# Altium footprint library Sockets.PcbLib: 80 footprints (part 1 of 6)
Each footprint in its own frame and in the unit in brackets; x right, y up, seen from the top. Pads: shape width x height; smd on the part's side, far side on the other; paste and mask are expansions set on the pad; w line width, h text height; cw(c..) or ccw(c..) is an arc to the next point about the centre after c.
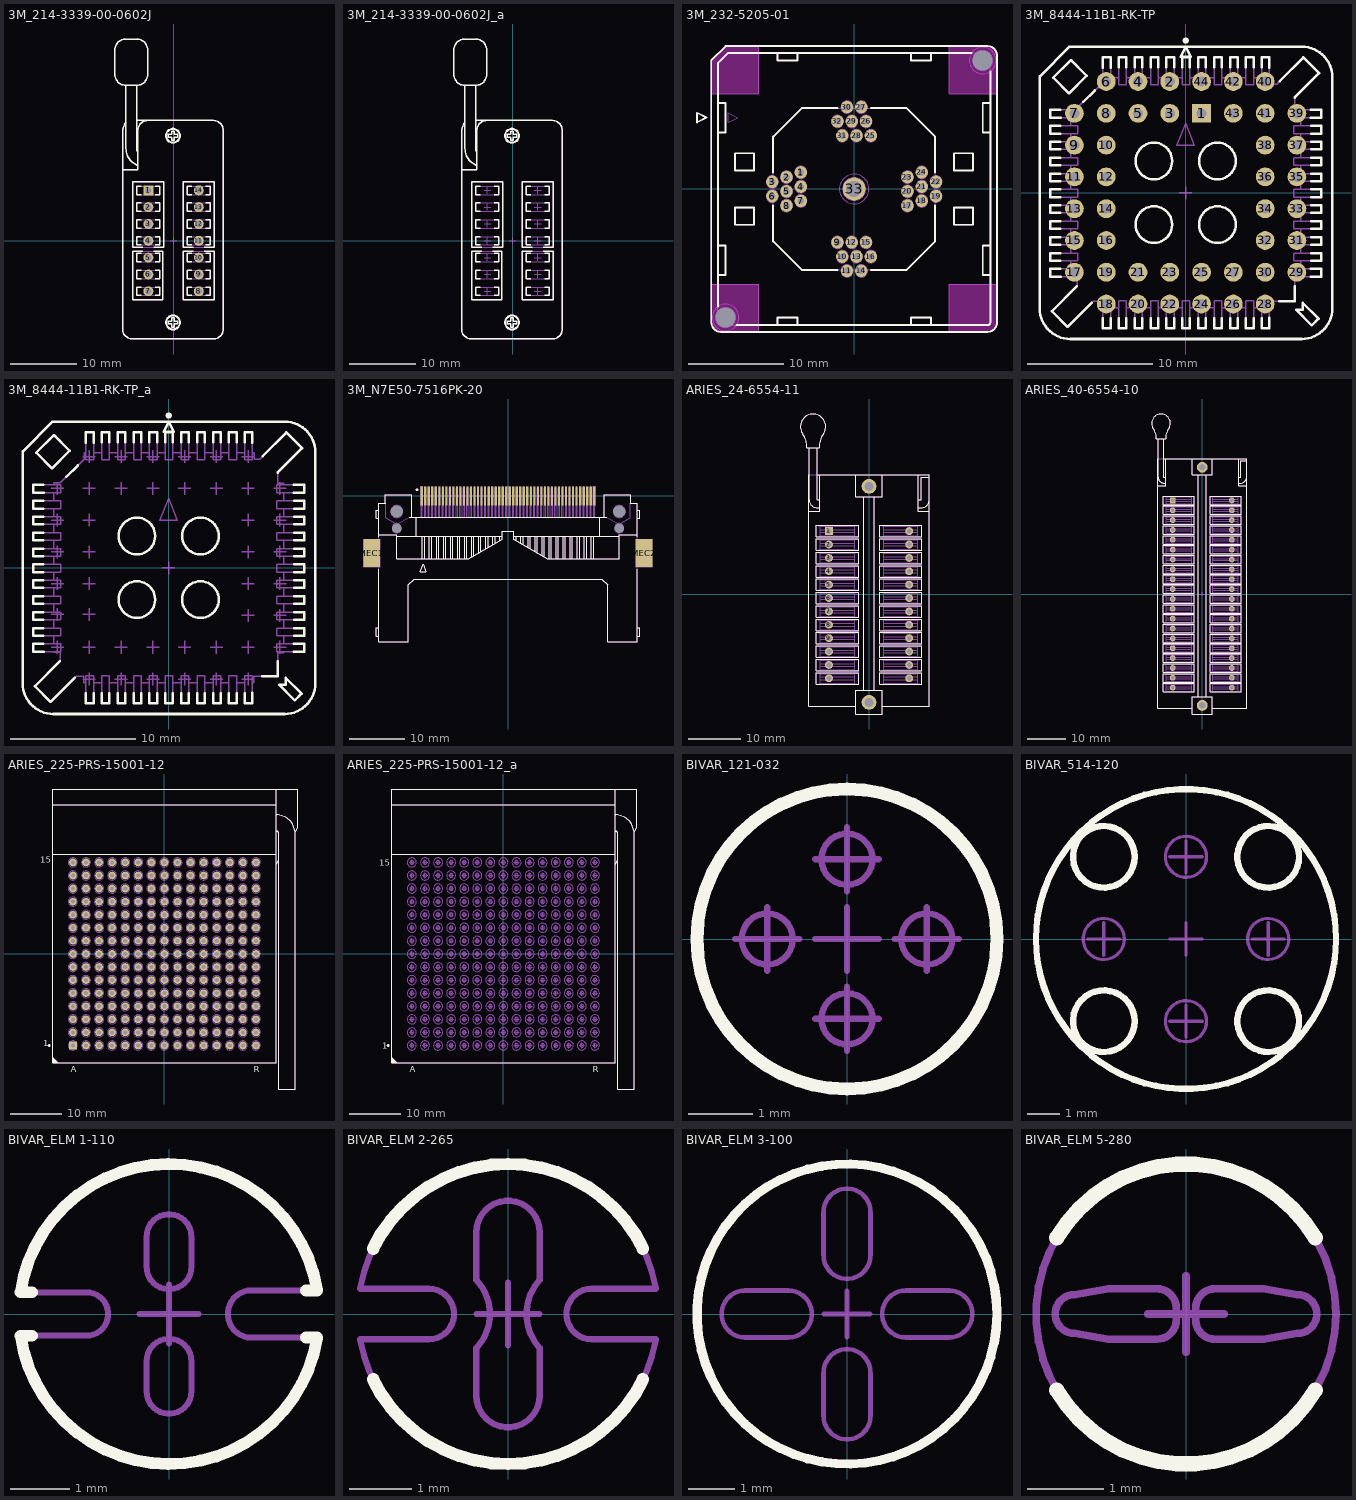
[diagram p0: the footprints below, top view; thin cyan lines are the x and y axes]

## 3M_214-3339-00-0602J [mm] "Pitch 2.54mm, Row-to-Row Spacing 7.62mm, DIP14  ZIF Test Socket"
height 11.9
pads (14):
  rect 1.5x1.5 hole 1: 1(-3.81,7.62)
  round 1.5 hole 1: 2(-3.81,5.08) 3(-3.81,2.54) 4(-3.81,0) 5(-3.81,-2.54) 6(-3.81,-5.08) 7(-3.81,-7.62) 8(3.81,-7.62) 9(3.81,-5.08) 10(3.81,-2.54) 11(3.81,0) 12(3.81,2.54) 13(3.81,5.08) 14(3.81,7.62)
Top Overlay:
  drawing of 156 lines, arcs and shapes, not listed
Mechanical 8:
  lines w0.1: -4.31,-7.62 -3.81,-7.62 ; -4.31,-5.08 -3.81,-5.08 ; -4.31,-2.54 -3.81,-2.54 ; -4.31,0 -3.81,0 ; -4.31,2.54 -3.81,2.54 ; -4.31,5.08 -3.81,5.08 ; -4.31,7.62 -3.81,7.62 ; -3.81,-8.12 -3.81,-7.62 ; -3.81,-7.12 -3.81,-7.62 ; -3.81,-5.58 -3.81,-5.08 ; -3.81,-4.58 -3.81,-5.08 ; -3.81,-3.04 -3.81,-2.54 ; -3.81,-2.04 -3.81,-2.54 ; -3.81,-0.5 -3.81,0 ; -3.81,0.5 -3.81,0 ; -3.81,2.04 -3.81,2.54 ; -3.81,3.04 -3.81,2.54 ; -3.81,4.58 -3.81,5.08 ; -3.81,5.58 -3.81,5.08 ; -3.81,7.12 -3.81,7.62 ; -3.81,8.12 -3.81,7.62 ; -3.31,-7.62 -3.81,-7.62 ; -3.31,-5.08 -3.81,-5.08 ; -3.31,-2.54 -3.81,-2.54 ; -3.31,0 -3.81,0 ; -3.31,2.54 -3.81,2.54 ; -3.31,5.08 -3.81,5.08 ; -3.31,7.62 -3.81,7.62 ; -0.5,0 0,0 ; 0,-0.5 0,0 ; 0,0.5 0,0 ; 0.5,0 0,0 ; 3.31,-7.62 3.81,-7.62 ; 3.31,-5.08 3.81,-5.08 ; 3.31,-2.54 3.81,-2.54 ; 3.31,0 3.81,0 ; 3.31,2.54 3.81,2.54 ; 3.31,5.08 3.81,5.08 ; 3.31,7.62 3.81,7.62 ; 3.81,-8.12 3.81,-7.62 ; 3.81,-7.12 3.81,-7.62 ; 3.81,-5.58 3.81,-5.08 ; 3.81,-4.58 3.81,-5.08 ; 3.81,-3.04 3.81,-2.54 ; 3.81,-2.04 3.81,-2.54 ; 3.81,-0.5 3.81,0 ; 3.81,0.5 3.81,0 ; 3.81,2.04 3.81,2.54 ; 3.81,3.04 3.81,2.54 ; 3.81,4.58 3.81,5.08 ; 3.81,5.58 3.81,5.08 ; 3.81,7.12 3.81,7.62 ; 3.81,8.12 3.81,7.62 ; 4.31,-7.62 3.81,-7.62 ; 4.31,-5.08 3.81,-5.08 ; 4.31,-2.54 3.81,-2.54 ; 4.31,0 3.81,0 ; 4.31,2.54 3.81,2.54 ; 4.31,5.08 3.81,5.08 ; 4.31,7.62 3.81,7.62
Mechanical 14:
  circle w0.1: c-0.09,15.87 r1.1
  circle w0.1: c-0.09,15.87 r1
  circle w0.1: c-0.09,-12.33 r1
  circle w0.1: c-0.09,-12.33 r1.1
  lines w0.1: -7.69,10.73 -5.39,10.73 -5.39,16.67 cw(c-3.89,16.67) -3.89,18.17 ; -7.19,17.788 ccw(c-6.19,16.67) -7.69,16.67 -7.69,-13.33 ccw(c-6.19,-13.33) -6.19,-14.83 6.01,-14.83 ccw(c6.01,-13.33) 7.51,-13.33 7.51,16.67 ccw(c6.01,16.67) 6.01,18.17 -5.59,18.17 ; -6.89,30.47 -5.89,30.47 ; -5.39,11.355 cw(c-4.39,13.97) -7.19,13.97 -7.19,23.47 ; -5.39,13.307 cw(c-4.39,13.97) -5.59,13.97 -5.59,23.47 ; -7.19,23.47 cw(c-7.19,25.17) -8.89,25.17 -8.89,28.77 cw(c-7.19,28.77) -7.19,30.47 -5.59,30.47 cw(c-5.59,28.77) -3.89,28.77 -3.89,25.17 cw(c-5.59,25.17) -5.59,23.47 ; -7.19,23.47 -5.59,23.47 ; -6.16,-8.89 -1.619,-8.89 -1.619,-1.587 -6.16,-1.587 -6.16,-8.89 ; -6.16,-0.953 -1.46,-0.953 -1.46,8.89 -6.16,8.89 -6.16,-0.953 ; -5.525,-8.255 -2.095,-8.255 -2.095,-6.985 -5.525,-6.985 -5.525,-8.255 ; -5.525,-5.715 -2.095,-5.715 -2.095,-4.445 -5.525,-4.445 -5.525,-5.715 ; -5.525,-3.175 -2.095,-3.175 -2.095,-1.905 -5.525,-1.905 -5.525,-3.175 ; -5.525,-0.635 -2.095,-0.635 -2.095,0.635 -5.525,0.635 -5.525,-0.635 ; -5.525,1.905 -2.095,1.905 -2.095,3.175 -5.525,3.175 -5.525,1.905 ; -5.525,4.445 -2.095,4.445 -2.095,5.715 -5.525,5.715 -5.525,4.445 ; -5.525,6.985 -2.095,6.985 -2.095,8.255 -5.525,8.255 -5.525,6.985 ; -0.79,-12.53 -0.29,-12.53 -0.29,-13.03 0.11,-13.03 0.11,-12.53 0.61,-12.53 0.61,-12.13 0.11,-12.13 0.11,-11.63 -0.29,-11.63 -0.29,-12.13 -0.79,-12.13 -0.79,-12.53 ; -0.79,15.67 -0.29,15.67 -0.29,15.17 0.11,15.17 0.11,15.67 0.61,15.67 0.61,16.07 0.11,16.07 0.11,16.57 -0.29,16.57 -0.29,16.07 -0.79,16.07 -0.79,15.67 ; 1.46,-8.89 6.16,-8.89 6.16,-1.587 1.46,-1.587 1.46,-8.89 ; 1.46,-0.953 6.16,-0.953 6.16,8.89 1.46,8.89 1.46,-0.953 ; 2.095,-8.255 5.525,-8.255 5.525,-6.985 2.095,-6.985 2.095,-8.255 ; 2.095,-5.715 5.525,-5.715 5.525,-4.445 2.095,-4.445 2.095,-5.715 ; 2.095,-3.175 5.525,-3.175 5.525,-1.905 2.095,-1.905 2.095,-3.175 ; 2.095,-0.635 5.525,-0.635 5.525,0.635 2.095,0.635 2.095,-0.635 ; 2.095,1.905 5.525,1.905 5.525,3.175 2.095,3.175 2.095,1.905 ; 2.095,4.445 5.525,4.445 5.525,5.715 2.095,5.715 2.095,4.445 ; 2.095,6.985 5.525,6.985 5.525,8.255 2.095,8.255 2.095,6.985
3D body "3M_214-3339-00-0602J.stp": height 11.9, standoff -2.79, extent -8.89,-14.83 7.51,30.47

## 3M_214-3339-00-0602J_a [mm] "Pitch 2.54mm, Row-to-Row Spacing 7.62mm, DIP14  ZIF Test Socket"
height 11.9
Top Overlay:
  drawing of 156 lines, arcs and shapes, not listed
Mechanical 8:
  lines w0.1: -4.31,-7.62 -3.81,-7.62 ; -4.31,-5.08 -3.81,-5.08 ; -4.31,-2.54 -3.81,-2.54 ; -4.31,0 -3.81,0 ; -4.31,2.54 -3.81,2.54 ; -4.31,5.08 -3.81,5.08 ; -4.31,7.62 -3.81,7.62 ; -3.81,-8.12 -3.81,-7.62 ; -3.81,-7.12 -3.81,-7.62 ; -3.81,-5.58 -3.81,-5.08 ; -3.81,-4.58 -3.81,-5.08 ; -3.81,-3.04 -3.81,-2.54 ; -3.81,-2.04 -3.81,-2.54 ; -3.81,-0.5 -3.81,0 ; -3.81,0.5 -3.81,0 ; -3.81,2.04 -3.81,2.54 ; -3.81,3.04 -3.81,2.54 ; -3.81,4.58 -3.81,5.08 ; -3.81,5.58 -3.81,5.08 ; -3.81,7.12 -3.81,7.62 ; -3.81,8.12 -3.81,7.62 ; -3.31,-7.62 -3.81,-7.62 ; -3.31,-5.08 -3.81,-5.08 ; -3.31,-2.54 -3.81,-2.54 ; -3.31,0 -3.81,0 ; -3.31,2.54 -3.81,2.54 ; -3.31,5.08 -3.81,5.08 ; -3.31,7.62 -3.81,7.62 ; -0.5,0 0,0 ; 0,-0.5 0,0 ; 0,0.5 0,0 ; 0.5,0 0,0 ; 3.31,-7.62 3.81,-7.62 ; 3.31,-5.08 3.81,-5.08 ; 3.31,-2.54 3.81,-2.54 ; 3.31,0 3.81,0 ; 3.31,2.54 3.81,2.54 ; 3.31,5.08 3.81,5.08 ; 3.31,7.62 3.81,7.62 ; 3.81,-8.12 3.81,-7.62 ; 3.81,-7.12 3.81,-7.62 ; 3.81,-5.58 3.81,-5.08 ; 3.81,-4.58 3.81,-5.08 ; 3.81,-3.04 3.81,-2.54 ; 3.81,-2.04 3.81,-2.54 ; 3.81,-0.5 3.81,0 ; 3.81,0.5 3.81,0 ; 3.81,2.04 3.81,2.54 ; 3.81,3.04 3.81,2.54 ; 3.81,4.58 3.81,5.08 ; 3.81,5.58 3.81,5.08 ; 3.81,7.12 3.81,7.62 ; 3.81,8.12 3.81,7.62 ; 4.31,-7.62 3.81,-7.62 ; 4.31,-5.08 3.81,-5.08 ; 4.31,-2.54 3.81,-2.54 ; 4.31,0 3.81,0 ; 4.31,2.54 3.81,2.54 ; 4.31,5.08 3.81,5.08 ; 4.31,7.62 3.81,7.62
Mechanical 14:
  circle w0.1: c-0.09,15.87 r1.1
  circle w0.1: c-0.09,15.87 r1
  circle w0.1: c-0.09,-12.33 r1
  circle w0.1: c-0.09,-12.33 r1.1
  lines w0.1: -7.69,10.73 -5.39,10.73 -5.39,16.67 cw(c-3.89,16.67) -3.89,18.17 ; -7.19,17.788 ccw(c-6.19,16.67) -7.69,16.67 -7.69,-13.33 ccw(c-6.19,-13.33) -6.19,-14.83 6.01,-14.83 ccw(c6.01,-13.33) 7.51,-13.33 7.51,16.67 ccw(c6.01,16.67) 6.01,18.17 -5.59,18.17 ; -6.89,30.47 -5.89,30.47 ; -5.39,11.355 cw(c-4.39,13.97) -7.19,13.97 -7.19,23.47 ; -5.39,13.307 cw(c-4.39,13.97) -5.59,13.97 -5.59,23.47 ; -7.19,23.47 cw(c-7.19,25.17) -8.89,25.17 -8.89,28.77 cw(c-7.19,28.77) -7.19,30.47 -5.59,30.47 cw(c-5.59,28.77) -3.89,28.77 -3.89,25.17 cw(c-5.59,25.17) -5.59,23.47 ; -7.19,23.47 -5.59,23.47 ; -6.16,-8.89 -1.619,-8.89 -1.619,-1.587 -6.16,-1.587 -6.16,-8.89 ; -6.16,-0.953 -1.46,-0.953 -1.46,8.89 -6.16,8.89 -6.16,-0.953 ; -5.525,-8.255 -2.095,-8.255 -2.095,-6.985 -5.525,-6.985 -5.525,-8.255 ; -5.525,-5.715 -2.095,-5.715 -2.095,-4.445 -5.525,-4.445 -5.525,-5.715 ; -5.525,-3.175 -2.095,-3.175 -2.095,-1.905 -5.525,-1.905 -5.525,-3.175 ; -5.525,-0.635 -2.095,-0.635 -2.095,0.635 -5.525,0.635 -5.525,-0.635 ; -5.525,1.905 -2.095,1.905 -2.095,3.175 -5.525,3.175 -5.525,1.905 ; -5.525,4.445 -2.095,4.445 -2.095,5.715 -5.525,5.715 -5.525,4.445 ; -5.525,6.985 -2.095,6.985 -2.095,8.255 -5.525,8.255 -5.525,6.985 ; -0.79,-12.53 -0.29,-12.53 -0.29,-13.03 0.11,-13.03 0.11,-12.53 0.61,-12.53 0.61,-12.13 0.11,-12.13 0.11,-11.63 -0.29,-11.63 -0.29,-12.13 -0.79,-12.13 -0.79,-12.53 ; -0.79,15.67 -0.29,15.67 -0.29,15.17 0.11,15.17 0.11,15.67 0.61,15.67 0.61,16.07 0.11,16.07 0.11,16.57 -0.29,16.57 -0.29,16.07 -0.79,16.07 -0.79,15.67 ; 1.46,-8.89 6.16,-8.89 6.16,-1.587 1.46,-1.587 1.46,-8.89 ; 1.46,-0.953 6.16,-0.953 6.16,8.89 1.46,8.89 1.46,-0.953 ; 2.095,-8.255 5.525,-8.255 5.525,-6.985 2.095,-6.985 2.095,-8.255 ; 2.095,-5.715 5.525,-5.715 5.525,-4.445 2.095,-4.445 2.095,-5.715 ; 2.095,-3.175 5.525,-3.175 5.525,-1.905 2.095,-1.905 2.095,-3.175 ; 2.095,-0.635 5.525,-0.635 5.525,0.635 2.095,0.635 2.095,-0.635 ; 2.095,1.905 5.525,1.905 5.525,3.175 2.095,3.175 2.095,1.905 ; 2.095,4.445 5.525,4.445 5.525,5.715 2.095,5.715 2.095,4.445 ; 2.095,6.985 5.525,6.985 5.525,8.255 2.095,8.255 2.095,6.985
3D body "3M_214-3339-00-0602J.stp": height 11.9, standoff -2.79, extent -8.89,-14.83 7.51,30.47

## 3M_232-5205-01 [mm] "Through Hole Socket for 0.5mm Pitch 32 Pins QFN, Body 30 x30mm"
height 14.5
pads (35):
  round 1.3 hole 0.7: 1(-5.6,1.75) 2(-7.1,1.25) 3(-8.6,0.75) 4(-5.6,0.25) 5(-7.1,-0.25) 6(-8.6,-0.75) 7(-5.6,-1.25) 8(-7.1,-1.75) 9(-1.75,-5.6) 10(-1.25,-7.1) 11(-0.75,-8.6) 12(-0.25,-5.6) 13(0.25,-7.1) 14(0.75,-8.6) 15(1.25,-5.6) 16(1.75,-7.1) 17(5.6,-1.75) 18(7.1,-1.25) 19(8.6,-0.75) 20(5.6,-0.25) 21(7.1,0.25) 22(8.6,0.75) 23(5.6,1.25) 24(7.1,1.75) 25(1.75,5.6) 26(1.25,7.1) 27(0.75,8.6) 28(0.25,5.6) 29(-0.25,7.1) 30(-0.75,8.6) 31(-1.25,5.6) 32(-1.75,7.1)
  round 2.4 hole 1.7: 33(0,0)
  round 0.5 hole 2.1 unplated mask+0.8: 34(-13.5,-13.5) 35(13.5,13.5)
Top Layer keep-out:
  region: -10,-10 -10,-15 -14,-15 -14.098,-15 -14.292,-14.962 -14.474,-14.886 -14.637,-14.777 -14.777,-14.637 -14.886,-14.474 -14.962,-14.292 -15,-14.098 -15,-14 -15,-10
  region: 10,-10 15,-10 15,-14 15,-14.098 14.962,-14.292 14.886,-14.474 14.777,-14.637 14.637,-14.777 14.474,-14.886 14.292,-14.962 14.098,-15 14,-15 10,-15
  region: 10,10 10,15 14,15 14.098,15 14.292,14.962 14.474,14.886 14.637,14.777 14.777,14.637 14.886,14.474 14.962,14.292 15,14.098 15,14 15,10
  region: -10,15 -13.5,15 -15,13.5 -15,10 -10,10
Top Overlay:
  lines w0.2: -14.3,-12.351 -14.3,13.21 -13.21,14.3 12.351,14.3 ; -14.3,-9.05 -13.5,-9.05 -13.5,-5.95 -14.3,-5.95 ; -14.3,5.95 -13.5,5.95 -13.5,9.05 -14.3,9.05 ; -12.351,-14.3 14,-14.3 ccw(c14,-14) 14.3,-14 14.3,12.351 ; -8.5,-1.745 -8.5,-5.5 -5.5,-8.5 -1.745,-8.5 ; -8.5,1.745 -8.5,5.5 -5.5,8.5 -1.745,8.5 ; -8.05,-14.3 -8.05,-13.5 -5.95,-13.5 -5.95,-14.3 ; -8.05,14.3 -8.05,13.5 -5.95,13.5 -5.95,14.3 ; 1.745,-8.5 5.5,-8.5 8.5,-5.5 8.5,-1.745 ; 1.745,8.5 5.5,8.5 8.5,5.5 8.5,1.745 ; 5.95,-14.3 5.95,-13.5 8.05,-13.5 8.05,-14.3 ; 5.95,14.3 5.95,13.5 8.05,13.5 8.05,14.3 ; 14.3,-9.05 13.5,-9.05 13.5,-5.95 14.3,-5.95 ; 14.3,5.95 13.5,5.95 13.5,9.05 14.3,9.05 ; -16.5,7 -15.5,7.5 -16.5,8 -16.5,7 ; -15,-14 ccw(c-14,-14) -14,-15 14,-15 ccw(c14,-14) 15,-14 15,14 ccw(c14,14) 14,15 -13.5,15 -15,13.5 -15,-14 ; -12.5,-3.75 -10.5,-3.75 -10.5,-1.95 -12.5,-1.95 -12.5,-3.75 ; -12.5,1.95 -12.5,3.75 -10.5,3.75 -10.5,1.95 -12.5,1.95 ; 10.5,-3.75 10.5,-1.95 12.5,-1.95 12.5,-3.75 10.5,-3.75 ; 10.5,1.95 10.5,3.75 12.5,3.75 12.5,1.95 10.5,1.95
Mechanical 8:
  drawing of 211 lines, arcs and shapes, not listed
Mechanical 14:
  lines w0.1: -14.3,-9.05 -13.5,-9.05 -13.5,-5.95 -14.3,-5.95 ; -14.3,5.95 -13.5,5.95 -13.5,9.05 -14.3,9.05 ; -8.05,-14.3 -8.05,-13.5 -5.95,-13.5 -5.95,-14.3 ; -8.05,14.3 -8.05,13.5 -5.95,13.5 -5.95,14.3 ; 5.95,-14.3 5.95,-13.5 8.05,-13.5 8.05,-14.3 ; 5.95,14.3 5.95,13.5 8.05,13.5 8.05,14.3 ; 14.3,-9.05 13.5,-9.05 13.5,-5.95 14.3,-5.95 ; 14.3,5.95 13.5,5.95 13.5,9.05 14.3,9.05 ; -15,-14 ccw(c-14,-14) -14,-15 14,-15 ccw(c14,-14) 15,-14 15,14 ccw(c14,14) 14,15 -13.5,15 -15,13.5 -15,-14 ; -14.3,-14 ccw(c-14,-14) -14,-14.3 14,-14.3 ccw(c14,-14) 14.3,-14 14.3,14 ccw(c14,14) 14,14.3 -13.21,14.3 -14.3,13.21 -14.3,-14 ; -13.2,7 -12.2,7.5 -13.2,8 -13.2,7 ; -12.5,-3.75 -10.5,-3.75 -10.5,-1.95 -12.5,-1.95 -12.5,-3.75 ; -12.5,1.95 -12.5,3.75 -10.5,3.75 -10.5,1.95 -12.5,1.95 ; -8.5,-5.5 -5.5,-8.5 5.5,-8.5 8.5,-5.5 8.5,5.5 5.5,8.5 -5.5,8.5 -8.5,5.5 -8.5,-5.5 ; 10.5,-3.75 10.5,-1.95 12.5,-1.95 12.5,-3.75 10.5,-3.75 ; 10.5,1.95 10.5,3.75 12.5,3.75 12.5,1.95 10.5,1.95
3D body "3M_232-5205-01.stp": height 17, standoff -3, extent -15,-15 15,15

## 3M_8444-11B1-RK-TP [mm] "44 Leads Through Hole PLCC Socket, Pitch 1.27 mm, Body 23.5x23.5mm"
height 8
pads (44):
  rect 1.5x1.5 hole 0.8: 1(1.27,6.35)
  round 1.5 hole 0.8: 2(-1.27,8.89) 3(-1.27,6.35) 4(-3.81,8.89) 5(-3.81,6.35) 6(-6.35,8.89) 7(-8.89,6.35) 8(-6.35,6.35) 9(-8.89,3.81) 10(-6.35,3.81) 11(-8.89,1.27) 12(-6.35,1.27) 13(-8.89,-1.27) 14(-6.35,-1.27) 15(-8.89,-3.81) 16(-6.35,-3.81) 17(-8.89,-6.35) 18(-6.35,-8.89) 19(-6.35,-6.35) 20(-3.81,-8.89) 21(-3.81,-6.35) 22(-1.27,-8.89) 23(-1.27,-6.35) 24(1.27,-8.89) 25(1.27,-6.35) 26(3.81,-8.89) 27(3.81,-6.35) 28(6.35,-8.89) 29(8.89,-6.35) 30(6.35,-6.35) 31(8.89,-3.81) 32(6.35,-3.81) 33(8.89,-1.27) 34(6.35,-1.27) 35(8.89,1.27) 36(6.35,1.27) 37(8.89,3.81) 38(6.35,3.81) 39(8.89,6.35) 40(6.35,8.89) 41(6.35,6.35) 42(3.81,8.89) 43(3.81,6.35) 44(1.27,8.89)
Top Overlay:
  drawing of 166 lines, arcs and shapes, not listed
Mechanical 8:
  drawing of 356 lines, arcs and shapes, not listed
Mechanical 14:
  drawing of 272 lines, arcs and shapes, not listed
3D body "3M_8444-11B1-RK-TP.stp": height 8, standoff -3.07, extent -11.659,-11.685 11.709,11.685

## 3M_8444-11B1-RK-TP_a [mm] "44 Leads Through Hole PLCC Socket, Pitch 1.27 mm, Body 23.5x23.5mm"
height 8
Top Overlay:
  drawing of 166 lines, arcs and shapes, not listed
Mechanical 8:
  drawing of 356 lines, arcs and shapes, not listed
Mechanical 14:
  drawing of 272 lines, arcs and shapes, not listed
3D body "3M_8444-11B1-RK-TP.stp": height 8, standoff -3.07, extent -11.659,-11.685 11.709,11.685

## 3M_N7E50-7516PK-20 [mm] "50 Contacts, Right Angle, Surface Mount CompactFlash Card Header Type I"
height 6.72
pads (56):
  rect 0.4x3.5 smd: 1(-15.558,0) 2(-14.288,0) 3(-13.018,0) 4(-11.748,0) 5(-10.478,0) 6(-9.208,0) 7(-7.938,0) 8(-6.668,0) 9(-5.398,0) 10(-4.128,0) 11(-2.858,0) 12(-1.588,0) 13(-0.318,0) 14(0.952,0) 15(2.222,0) 16(3.492,0) 17(4.762,0) 18(6.032,0) 19(7.302,0) 20(8.572,0) 21(9.842,0) 22(11.112,0) 23(12.382,0) 24(13.652,0) 25(14.922,0) 26(-14.923,0) 27(-13.653,0) 28(-12.383,0) 29(-11.113,0) 30(-9.843,0) 31(-8.573,0) 32(-7.303,0) 33(-6.033,0) 34(-4.763,0) 35(-3.493,0) 36(-2.223,0) 37(-0.953,0) 38(0.317,0) 39(1.587,0) 40(2.857,0) 41(4.127,0) 42(5.397,0) 43(6.667,0) 44(7.937,0) 45(9.207,0) 46(10.477,0) 47(11.747,0) 48(13.017,0) 49(14.287,0) 50(15.557,0)
  rect 3x5 smd: MEC1(-24.565,-10.3) MEC2(24.565,-10.3)
  round 0.5 hole 2.2 unplated: MEC3(-20.08,-2.8) MEC4(20.08,-2.8)
  round 0.5 hole 1.7 unplated: MEC5(-20.08,-5.8) MEC6(20.08,-5.8)
Top Overlay:
  circle w0.25: c-16.4,1.116 r0.125
  lines w0.2: -23.315,-23.8 -23.815,-23.8 -23.815,-25.3 -23.315,-25.3 -23.315,-13.2 -23.315,-26.3 -17.96,-26.3 -17.96,-16 -16.96,-15 16.96,-15 17.96,-16 17.96,-26.3 23.315,-26.3 23.315,-13.2 ; -23.315,-7 -20.08,-7 -20.08,-11.3 -7.062,-11.3 -1,-7.8 -1,-6.4 1,-6.4 1,-7.8 7.062,-11.3 20.08,-11.3 20.08,-7 23.315,-7 ; -23.315,-2.55 -23.815,-2.55 -23.815,-4.05 -23.315,-4.05 -23.315,-7.4 -23.315,-1.3 -22.08,-1.3 ; -22.18,-1.3 -22.18,0.2 -17.375,0.2 -17.375,-3.8 ; -20.08,-7.3 -1,-7.3 ; -17.812,-3.8 -17.375,-3.8 ; -16.58,-7.3 -16.58,-3.8 ; -15.44,-11.3 -15.44,-7.3 ; -15.04,-11.3 -15.04,-7.3 ; -14.17,-11.3 -14.17,-7.3 ; -13.77,-11.3 -13.77,-7.3 ; -12.9,-11.3 -12.9,-7.3 ; -12.5,-11.3 -12.5,-7.3 ; -11.63,-11.3 -11.63,-7.3 ; -11.23,-11.3 -11.23,-7.3 ; -10.36,-11.3 -10.36,-7.3 ; -9.96,-11.3 -9.96,-7.3 ; -9.084,-11.3 -9.084,-7.3 ; -8.684,-11.3 -8.684,-7.3 ; -7.814,-11.3 -7.814,-7.3 ; -7.414,-11.3 -7.414,-7.3 ; -6.544,-11.001 -6.544,-7.3 ; -6.144,-10.77 -6.144,-7.3 ; -5.274,-10.268 -5.274,-7.3 ; -4.874,-10.037 -4.874,-7.3 ; -4.004,-9.535 -4.004,-7.3 ; -3.604,-9.304 -3.604,-7.3 ; -2.734,-8.801 -2.734,-7.3 ; -2.334,-8.57 -2.334,-7.3 ; -1.464,-8.068 -1.464,-7.3 ; -1.064,-7.837 -1.064,-7.3 ; 1,-7.3 20.08,-7.3 ; 1.076,-7.844 1.076,-7.3 ; 1.476,-8.075 1.476,-7.3 ; 2.346,-8.577 2.346,-7.3 ; 2.746,-8.808 2.746,-7.3 ; 3.616,-9.31 3.616,-7.3 ; 4.016,-9.541 4.016,-7.3 ; 4.886,-10.043 4.886,-7.3 ; 5.286,-10.274 5.286,-7.3 ; 6.156,-10.777 6.156,-7.3 ; 6.556,-11.008 6.556,-7.3 ; 7.426,-11.3 7.426,-7.3 ; 7.826,-11.3 7.826,-7.3 ; 8.696,-11.3 8.696,-7.3 ; 9.096,-11.3 9.096,-7.3 ; 9.966,-11.3 9.966,-7.3 ; 10.366,-11.3 10.366,-7.3 ; 11.236,-11.3 11.236,-7.3 ; 11.636,-11.3 11.636,-7.3 ; 12.506,-11.3 12.506,-7.3 ; 12.906,-11.3 12.906,-7.3 ; 13.776,-11.3 13.776,-7.3 ; 14.176,-11.3 14.176,-7.3 ; 15.046,-11.3 15.046,-7.3 ; 15.446,-11.3 15.446,-7.3 ; 16.58,-7.3 16.58,-3.8 ; 17.812,-3.8 17.375,-3.8 ; 22.08,-1.3 23.315,-1.3 23.315,-7.4 ; 22.18,-1.3 22.18,0.2 17.375,0.2 17.375,-3.8 ; 23.315,-25.3 23.815,-25.3 23.815,-23.8 23.315,-23.8 ; 23.315,-4.05 23.815,-4.05 23.815,-2.55 23.315,-2.55 ; -17.375,-3.8 17.375,-3.8 ; -15.8,-13.7 -14.8,-13.7 -15.3,-12.3 -15.8,-13.7
Mechanical 8:
  circle w0.1: c-20.08,-2.8 r1.1
  circle w0.1: c20.08,-2.8 r1.1
  circle w0.1: c20.08,-5.8 r0.85
  circle w0.1: c-20.08,-5.8 r0.85
  lines w0.1: -25.065,-10.3 -24.565,-10.3 ; -24.565,-10.8 -24.565,-10.3 ; -24.565,-9.8 -24.565,-10.3 ; -24.065,-10.3 -24.565,-10.3 ; -20.58,-5.8 -20.08,-5.8 ; -20.58,-2.8 -20.08,-2.8 ; -20.08,-6.3 -20.08,-5.8 ; -20.08,-5.3 -20.08,-5.8 ; -20.08,-3.3 -20.08,-2.8 ; -20.08,-2.3 -20.08,-2.8 ; -19.58,-5.8 -20.08,-5.8 ; -19.58,-2.8 -20.08,-2.8 ; -15.558,-1.75 -15.558,0 ; -15.558,1.75 -15.558,0 ; -14.923,-1.75 -14.923,0 -14.923,1.75 ; -14.288,-1.75 -14.288,0 -14.288,1.75 ; -13.653,-1.75 -13.653,0 -13.653,1.75 ; -13.018,-1.75 -13.018,0 -13.018,1.75 ; -12.383,-1.75 -12.383,0 -12.383,1.75 ; -11.748,-1.75 -11.748,0 -11.748,1.75 ; -11.113,-1.75 -11.113,0 -11.113,1.75 ; -10.478,-1.75 -10.478,0 -10.478,1.75 ; -9.843,-1.75 -9.843,0 -9.843,1.75 ; -9.208,-1.75 -9.208,0 -9.208,1.75 ; -8.573,-1.75 -8.573,0 -8.573,1.75 ; -7.938,-1.75 -7.938,0 -7.938,1.75 ; -7.303,-1.75 -7.303,0 -7.303,1.75 ; -6.668,-1.75 -6.668,0 -6.668,1.75 ; -6.033,-1.75 -6.033,0 -6.033,1.75 ; -5.398,-1.75 -5.398,0 -5.398,1.75 ; -4.763,-1.75 -4.763,0 -4.763,1.75 ; -4.128,-1.75 -4.128,0 -4.128,1.75 ; -3.493,-1.75 -3.493,0 -3.493,1.75 ; -2.858,-1.75 -2.858,0 -2.858,1.75 ; -2.222,-1.75 -2.222,0 -2.222,1.75 ; -1.587,-1.75 -1.587,0 -1.587,1.75 ; -0.953,-1.75 -0.953,0 -0.953,1.75 ; -0.318,-1.75 -0.318,0 -0.318,1.75 ; 0,-0.5 0,0 0,0.5 ; 0.318,-1.75 0.318,0 0.318,1.75 ; 0.953,-1.75 0.953,0 0.953,1.75 ; 1.587,-1.75 1.587,0 1.587,1.75 ; 2.222,-1.75 2.222,0 2.222,1.75 ; 2.858,-1.75 2.858,0 2.858,1.75 ; 3.493,-1.75 3.493,0 3.493,1.75 ; 4.128,-1.75 4.128,0 4.128,1.75 ; 4.763,-1.75 4.763,0 4.763,1.75 ; 5.398,-1.75 5.398,0 5.398,1.75 ; 6.033,-1.75 6.033,0 6.033,1.75 ; 6.668,-1.75 6.668,0 6.668,1.75 ; 7.303,-1.75 7.303,0 7.303,1.75 ; 7.938,-1.75 7.938,0 7.938,1.75 ; 8.573,-1.75 8.573,0 8.573,1.75 ; 9.208,-1.75 9.208,0 9.208,1.75 ; 9.843,-1.75 9.843,0 9.843,1.75 ; 10.478,-1.75 10.478,0 10.478,1.75 ; 11.113,-1.75 11.113,0 11.113,1.75 ; 11.748,-1.75 11.748,0 11.748,1.75 ; 12.383,-1.75 12.383,0 12.383,1.75 ; 13.018,-1.75 13.018,0 13.018,1.75 ; 13.653,-1.75 13.653,0 13.653,1.75 ; 14.288,-1.75 14.288,0 14.288,1.75 ; 14.923,-1.75 14.923,0 14.923,1.75 ; 15.558,-1.75 15.558,0 ; 15.558,1.75 15.558,0 ; 19.58,-5.8 20.08,-5.8 ; 19.58,-2.8 20.08,-2.8 ; 20.08,-6.3 20.08,-5.8 ; 20.08,-5.3 20.08,-5.8 ; 20.08,-3.3 20.08,-2.8 ; 20.08,-2.3 20.08,-2.8 ; 20.58,-5.8 20.08,-5.8 ; 20.58,-2.8 20.08,-2.8 ; 24.065,-10.3 24.565,-10.3 ; 24.565,-10.8 24.565,-10.3 ; 24.565,-9.8 24.565,-10.3 ; 25.065,-10.3 24.565,-10.3 ; -15.558,0 15.558,0 ; -26.065,-12.8 -23.065,-12.8 -23.065,-7.8 -26.065,-7.8 -26.065,-12.8 ; -15.758,-1.75 -15.758,1.75 -15.358,1.75 -15.358,-1.75 -15.758,-1.75 ; 15.358,-1.75 15.358,1.75 15.758,1.75 15.758,-1.75 15.358,-1.75 ; 23.065,-12.8 26.065,-12.8 26.065,-7.8 23.065,-7.8 23.065,-12.8
Mechanical 14:
  drawing of 285 lines, arcs and shapes, not listed
3D body "3M_N7E50-7516PK-20.stp": height 6.64, standoff -1, extent -25.315,-26.3 25.315,1.45

## ARIES_24-6554-11 [mm] "Universal Zero Insertion Force DIP Test Socket 24 Leads, Row Spacing 15.24mm; Pitch 2.54mm"
height 11.94
pads (26):
  rect 1.5x1.5 hole 0.9: 1(-7.62,11.985)
  round 1.5 hole 0.9: 2(-7.62,9.445) 3(-7.62,6.905) 4(-7.62,4.365) 5(-7.62,1.825) 6(-7.62,-0.715) 7(-7.62,-3.255) 8(-7.62,-5.795) 9(-7.62,-8.335) 10(-7.62,-10.875) 11(-7.62,-13.415) 12(-7.62,-15.955) 13(7.62,-15.955) 14(7.62,-13.415) 15(7.62,-10.875) 16(7.62,-8.335) 17(7.62,-5.795) 18(7.62,-3.255) 19(7.62,-0.715) 20(7.62,1.825) 21(7.62,4.365) 22(7.62,6.905) 23(7.62,9.445) 24(7.62,11.985)
  round 2.8 hole 1.7: MECH(0,-20.525) MECH(0,20.495)
Top Overlay:
  lines w0.2: -12.571,30.424 cw(c-15.806,28.071) -11.813,27.835 -9.447,27.835 cw(c-5.454,28.071) -8.689,30.424 ccw(c-10.63,31.835) -12.57,30.423 ; -11.43,15.735 -9.35,15.735 -9.35,22.735 ; -11.43,22.735 -11.43,-21.265 -2.54,-21.265 ; -11.38,27.835 -11.38,17.985 ccw(c-9.83,17.985) -9.83,16.435 -9.35,16.435 ; -9.88,22.735 11.43,22.735 11.43,-21.265 2.54,-21.265 ; -9.88,27.835 -9.88,17.985 ccw(c-9.83,17.985) -9.83,17.935 -9.35,17.935 ; -2.54,22.735 -2.54,18.535 2.54,18.535 2.54,22.735 ; -1,-18.265 -1,18.535 ; 1,-18.265 1,18.535 ; 9.35,16.435 9.88,16.435 ccw(c9.88,17.985) 11.43,17.985 ; 9.35,17.935 9.88,17.935 ccw(c9.88,17.985) 9.93,17.985 9.93,22.235 11.43,22.235 ; 9.35,22.735 9.35,15.735 11.43,15.735 ; -10,-17.055 -10,-14.855 -2,-14.855 -2,-17.055 -10,-17.055 ; -10,-14.515 -10,-12.315 -2,-12.315 -2,-14.515 -10,-14.515 ; -10,-11.975 -10,-9.775 -2,-9.775 -2,-11.975 -10,-11.975 ; -10,-9.435 -10,-7.235 -2,-7.235 -2,-9.435 -10,-9.435 ; -10,-6.895 -10,-4.695 -2,-4.695 -2,-6.895 -10,-6.895 ; -10,-4.355 -10,-2.155 -2,-2.155 -2,-4.355 -10,-4.355 ; -10,-1.815 -10,0.385 -2,0.385 -2,-1.815 -10,-1.815 ; -10,0.725 -10,2.925 -2,2.925 -2,0.725 -10,0.725 ; -10,3.265 -10,5.465 -2,5.465 -2,3.265 -10,3.265 ; -10,5.805 -10,8.005 -2,8.005 -2,5.805 -10,5.805 ; -10,8.345 -10,10.545 -2,10.545 -2,8.345 -10,8.345 ; -10,10.885 -10,13.085 -2,13.085 -2,10.885 -10,10.885 ; -2.54,-22.735 -2.54,-18.265 2.54,-18.265 2.54,-22.735 -2.54,-22.735 ; 2,-17.055 10,-17.055 10,-14.855 2,-14.855 2,-17.055 ; 2,-14.515 2,-12.315 10,-12.315 10,-14.515 2,-14.515 ; 2,-11.975 2,-9.775 10,-9.775 10,-11.975 2,-11.975 ; 2,-9.435 2,-7.235 10,-7.235 10,-9.435 2,-9.435 ; 2,-6.895 2,-4.695 10,-4.695 10,-6.895 2,-6.895 ; 2,-4.355 2,-2.155 10,-2.155 10,-4.355 2,-4.355 ; 2,-1.815 2,0.385 10,0.385 10,-1.815 2,-1.815 ; 2,0.725 2,2.925 10,2.925 10,0.725 2,0.725 ; 2,3.265 2,5.465 10,5.465 10,3.265 2,3.265 ; 2,5.805 2,8.005 10,8.005 10,5.805 2,5.805 ; 2,8.345 2,10.545 10,10.545 10,8.345 2,8.345 ; 2,10.885 2,13.085 10,13.085 10,10.885 2,10.885
Mechanical 8:
  lines w0.1: -8.12,-15.955 -7.62,-15.955 ; -8.12,-13.415 -7.62,-13.415 ; -8.12,-10.875 -7.62,-10.875 ; -8.12,-8.335 -7.62,-8.335 ; -8.12,-5.795 -7.62,-5.795 ; -8.12,-3.255 -7.62,-3.255 ; -8.12,-0.715 -7.62,-0.715 ; -8.12,1.825 -7.62,1.825 ; -8.12,4.365 -7.62,4.365 ; -8.12,6.905 -7.62,6.905 ; -8.12,9.445 -7.62,9.445 ; -8.12,11.985 -7.62,11.985 ; -7.62,-16.455 -7.62,-15.955 ; -7.62,-15.455 -7.62,-15.955 ; -7.62,-13.915 -7.62,-13.415 ; -7.62,-12.915 -7.62,-13.415 ; -7.62,-11.375 -7.62,-10.875 ; -7.62,-10.375 -7.62,-10.875 ; -7.62,-8.835 -7.62,-8.335 ; -7.62,-7.835 -7.62,-8.335 ; -7.62,-6.295 -7.62,-5.795 ; -7.62,-5.295 -7.62,-5.795 ; -7.62,-3.755 -7.62,-3.255 ; -7.62,-2.755 -7.62,-3.255 ; -7.62,-1.215 -7.62,-0.715 ; -7.62,-0.215 -7.62,-0.715 ; -7.62,1.325 -7.62,1.825 ; -7.62,2.325 -7.62,1.825 ; -7.62,3.865 -7.62,4.365 ; -7.62,4.865 -7.62,4.365 ; -7.62,6.405 -7.62,6.905 ; -7.62,7.405 -7.62,6.905 ; -7.62,8.945 -7.62,9.445 ; -7.62,9.945 -7.62,9.445 ; -7.62,11.485 -7.62,11.985 ; -7.62,12.485 -7.62,11.985 ; -7.12,-15.955 -7.62,-15.955 ; -7.12,-13.415 -7.62,-13.415 ; -7.12,-10.875 -7.62,-10.875 ; -7.12,-8.335 -7.62,-8.335 ; -7.12,-5.795 -7.62,-5.795 ; -7.12,-3.255 -7.62,-3.255 ; -7.12,-0.715 -7.62,-0.715 ; -7.12,1.825 -7.62,1.825 ; -7.12,4.365 -7.62,4.365 ; -7.12,6.905 -7.62,6.905 ; -7.12,9.445 -7.62,9.445 ; -7.12,11.985 -7.62,11.985 ; -0.5,-20.525 0,-20.525 ; -0.5,20.495 0,20.495 ; 0,-21.025 0,-20.525 ; 0,-20.025 0,-20.525 ; 0,19.995 0,20.495 ; 0,20.995 0,20.495 ; 0.5,-20.525 0,-20.525 ; 0.5,20.495 0,20.495 ; 7.12,-15.955 7.62,-15.955 ; 7.12,-13.415 7.62,-13.415 ; 7.12,-10.875 7.62,-10.875 ; 7.12,-8.335 7.62,-8.335 ; 7.12,-5.795 7.62,-5.795 ; 7.12,-3.255 7.62,-3.255 ; 7.12,-0.715 7.62,-0.715 ; 7.12,1.825 7.62,1.825 ; 7.12,4.365 7.62,4.365 ; 7.12,6.905 7.62,6.905 ; 7.12,9.445 7.62,9.445 ; 7.12,11.985 7.62,11.985 ; 7.62,-16.455 7.62,-15.955 ; 7.62,-15.455 7.62,-15.955 ; 7.62,-13.915 7.62,-13.415 ; 7.62,-12.915 7.62,-13.415 ; 7.62,-11.375 7.62,-10.875 ; 7.62,-10.375 7.62,-10.875 ; 7.62,-8.835 7.62,-8.335 ; 7.62,-7.835 7.62,-8.335 ; 7.62,-6.295 7.62,-5.795 ; 7.62,-5.295 7.62,-5.795 ; 7.62,-3.755 7.62,-3.255 ; 7.62,-2.755 7.62,-3.255 ; 7.62,-1.215 7.62,-0.715 ; 7.62,-0.215 7.62,-0.715 ; 7.62,1.325 7.62,1.825 ; 7.62,2.325 7.62,1.825 ; 7.62,3.865 7.62,4.365 ; 7.62,4.865 7.62,4.365 ; 7.62,6.405 7.62,6.905 ; 7.62,7.405 7.62,6.905 ; 7.62,8.945 7.62,9.445 ; 7.62,9.945 7.62,9.445 ; 7.62,11.485 7.62,11.985 ; 7.62,12.485 7.62,11.985 ; 8.12,-15.955 7.62,-15.955 ; 8.12,-13.415 7.62,-13.415 ; 8.12,-10.875 7.62,-10.875 ; 8.12,-8.335 7.62,-8.335 ; 8.12,-5.795 7.62,-5.795 ; 8.12,-3.255 7.62,-3.255 ; 8.12,-0.715 7.62,-0.715 ; 8.12,1.825 7.62,1.825 ; 8.12,4.365 7.62,4.365 ; 8.12,6.905 7.62,6.905 ; 8.12,9.445 7.62,9.445 ; 8.12,11.985 7.62,11.985
Mechanical 14:
  drawing of 372 lines, arcs and shapes, not listed
3D body "ARIES_24-6554-11.stp": height 11.94, standoff -2.28, extent -13.03,-22.735 11.43,34.229

## ARIES_40-6554-10 [mm] "Universal Zero Insertion Force DIP Test Socket 40 Leads, Row Spacing 15.24mm; Pitch 2.54mm"
height 11.94
pads (42):
  rect 1.5x1.5 hole 0.9: 1(-7.62,24.13)
  round 1.5 hole 0.9: 2(-7.62,21.59) 3(-7.62,19.05) 4(-7.62,16.51) 5(-7.62,13.97) 6(-7.62,11.43) 7(-7.62,8.89) 8(-7.62,6.35) 9(-7.62,3.81) 10(-7.62,1.27) 11(-7.62,-1.27) 12(-7.62,-3.81) 13(-7.62,-6.35) 14(-7.62,-8.89) 15(-7.62,-11.43) 16(-7.62,-13.97) 17(-7.62,-16.51) 18(-7.62,-19.05) 19(-7.62,-21.59) 20(-7.62,-24.13) 21(7.62,-24.13) 22(7.62,-21.59) 23(7.62,-19.05) 24(7.62,-16.51) 25(7.62,-13.97) 26(7.62,-11.43) 27(7.62,-8.89) 28(7.62,-6.35) 29(7.62,-3.81) 30(7.62,-1.27) 31(7.62,1.27) 32(7.62,3.81) 33(7.62,6.35) 34(7.62,8.89) 35(7.62,11.43) 36(7.62,13.97) 37(7.62,16.51) 38(7.62,19.05) 39(7.62,21.59) 40(7.62,24.13)
  round 2.8 hole 1.7: MECH(0,-28.7) MECH(0,32.64)
Top Overlay:
  drawing of 194 lines, arcs and shapes, not listed
Mechanical 8:
  drawing of 172 lines, arcs and shapes, not listed
Mechanical 14:
  drawing of 596 lines, arcs and shapes, not listed
3D body "ARIES_40-6554-10.stp": height 11.94, standoff -2.28, extent -13.03,-30.91 11.43,46.371

## ARIES_225-PRS-15001-12 [mm] "225 Contacts (15x15), Pitch 2.54mm,  PGA ZIF Test & Burn-in Socket"
height 10.92
pads (225):
  rect 1.5x1.5 hole 0.8: A1(-17.78,-17.78)
  round 1.5 hole 0.8: A2(-17.78,-15.24) A3(-17.78,-12.7) A4(-17.78,-10.16) A5(-17.78,-7.62) A6(-17.78,-5.08) A7(-17.78,-2.54) A8(-17.78,0) A9(-17.78,2.54) A10(-17.78,5.08) A11(-17.78,7.62) A12(-17.78,10.16) A13(-17.78,12.7) A14(-17.78,15.24) A15(-17.78,17.78) B1(-15.24,-17.78) B2(-15.24,-15.24) B3(-15.24,-12.7) B4(-15.24,-10.16) B5(-15.24,-7.62) B6(-15.24,-5.08) B7(-15.24,-2.54) B8(-15.24,0) B9(-15.24,2.54) B10(-15.24,5.08) B11(-15.24,7.62) B12(-15.24,10.16) B13(-15.24,12.7) B14(-15.24,15.24) B15(-15.24,17.78) C1(-12.7,-17.78) C2(-12.7,-15.24) C3(-12.7,-12.7) C4(-12.7,-10.16) C5(-12.7,-7.62) C6(-12.7,-5.08) C7(-12.7,-2.54) C8(-12.7,0) C9(-12.7,2.54) C10(-12.7,5.08) C11(-12.7,7.62) C12(-12.7,10.16) C13(-12.7,12.7) C14(-12.7,15.24) C15(-12.7,17.78) D1(-10.16,-17.78) D2(-10.16,-15.24) D3(-10.16,-12.7) D4(-10.16,-10.16) D5(-10.16,-7.62) D6(-10.16,-5.08) D7(-10.16,-2.54) D8(-10.16,0) D9(-10.16,2.54) D10(-10.16,5.08) D11(-10.16,7.62) D12(-10.16,10.16) D13(-10.16,12.7) D14(-10.16,15.24) D15(-10.16,17.78) E1(-7.62,-17.78) E2(-7.62,-15.24) E3(-7.62,-12.7) E4(-7.62,-10.16) E5(-7.62,-7.62) E6(-7.62,-5.08) E7(-7.62,-2.54) E8(-7.62,0) E9(-7.62,2.54) E10(-7.62,5.08) E11(-7.62,7.62) E12(-7.62,10.16) E13(-7.62,12.7) E14(-7.62,15.24) E15(-7.62,17.78) F1(-5.08,-17.78) F2(-5.08,-15.24) F3(-5.08,-12.7) F4(-5.08,-10.16) F5(-5.08,-7.62) F6(-5.08,-5.08) F7(-5.08,-2.54) F8(-5.08,0) F9(-5.08,2.54) F10(-5.08,5.08) F11(-5.08,7.62) F12(-5.08,10.16) F13(-5.08,12.7) F14(-5.08,15.24) F15(-5.08,17.78) G1(-2.54,-17.78) G2(-2.54,-15.24) G3(-2.54,-12.7) G4(-2.54,-10.16) G5(-2.54,-7.62) G6(-2.54,-5.08) G7(-2.54,-2.54) G8(-2.54,0) G9(-2.54,2.54) G10(-2.54,5.08) G11(-2.54,7.62) G12(-2.54,10.16) G13(-2.54,12.7) G14(-2.54,15.24) G15(-2.54,17.78) H1(0,-17.78) H2(0,-15.24) H3(0,-12.7) H4(0,-10.16) H5(0,-7.62) H6(0,-5.08) H7(0,-2.54) H8(0,0) H9(0,2.54) H10(0,5.08) H11(0,7.62) H12(0,10.16) H13(0,12.7) H14(0,15.24) H15(0,17.78) J1(2.54,-17.78) J2(2.54,-15.24) J3(2.54,-12.7) J4(2.54,-10.16) J5(2.54,-7.62) J6(2.54,-5.08) J7(2.54,-2.54) J8(2.54,0) J9(2.54,2.54) J10(2.54,5.08) J11(2.54,7.62) J12(2.54,10.16) J13(2.54,12.7) J14(2.54,15.24) J15(2.54,17.78) K1(5.08,-17.78) K2(5.08,-15.24) K3(5.08,-12.7) K4(5.08,-10.16) K5(5.08,-7.62) K6(5.08,-5.08) K7(5.08,-2.54) K8(5.08,0) K9(5.08,2.54) K10(5.08,5.08) K11(5.08,7.62) K12(5.08,10.16) K13(5.08,12.7) K14(5.08,15.24) K15(5.08,17.78) L1(7.62,-17.78) L2(7.62,-15.24) L3(7.62,-12.7) L4(7.62,-10.16) L5(7.62,-7.62) L6(7.62,-5.08) L7(7.62,-2.54) L8(7.62,0) L9(7.62,2.54) L10(7.62,5.08) L11(7.62,7.62) L12(7.62,10.16) L13(7.62,12.7) L14(7.62,15.24) L15(7.62,17.78) M1(10.16,-17.78) M2(10.16,-15.24) M3(10.16,-12.7) M4(10.16,-10.16) M5(10.16,-7.62) M6(10.16,-5.08) M7(10.16,-2.54) M8(10.16,0) M9(10.16,2.54) M10(10.16,5.08) M11(10.16,7.62) M12(10.16,10.16) M13(10.16,12.7) M14(10.16,15.24) M15(10.16,17.78) N1(12.7,-17.78) N2(12.7,-15.24) N3(12.7,-12.7) N4(12.7,-10.16) N5(12.7,-7.62) N6(12.7,-5.08) N7(12.7,-2.54) N8(12.7,0) N9(12.7,2.54) N10(12.7,5.08) N11(12.7,7.62) N12(12.7,10.16) N13(12.7,12.7) N14(12.7,15.24) N15(12.7,17.78) P1(15.24,-17.78) P2(15.24,-15.24) P3(15.24,-12.7) P4(15.24,-10.16) P5(15.24,-7.62) P6(15.24,-5.08) P7(15.24,-2.54) P8(15.24,0) P9(15.24,2.54) P10(15.24,5.08) P11(15.24,7.62) P12(15.24,10.16) P13(15.24,12.7) P14(15.24,15.24) P15(15.24,17.78) R1(17.78,-17.78) R2(17.78,-15.24) R3(17.78,-12.7) R4(17.78,-10.16) R5(17.78,-7.62) R6(17.78,-5.08) R7(17.78,-2.54) R8(17.78,0) R9(17.78,2.54) R10(17.78,5.08) R11(17.78,7.62) R12(17.78,10.16) R13(17.78,12.7) R14(17.78,15.24) R15(17.78,17.78)
Top Overlay:
  circle w0.25: c-22.4,-17.78 r0.125
  lines w0.2: -21.717,-20.958 -21.517,-21.158 ; -21.717,-20.758 -21.317,-21.158 ; -21.717,-20.558 -21.117,-21.158 ; -21.717,-20.358 -20.917,-21.158 ; -21.717,-20.158 -20.717,-21.158 ; -21.717,19.33 21.683,19.33 ; -21.717,29.013 21.683,29.013 ; 21.683,17.312 22.203,18.204 ; 21.683,23.832 21.793,23.832 cw(c21.793,23.422) 22.203,23.422 22.203,-26.238 ; 21.683,27.012 21.793,27.012 cw(c21.793,23.422) 25.383,23.422 25.383,-26.238 ; 25.376,23.647 25.903,24.552 25.903,32.042 21.683,32.042 ; 21.683,32.042 -21.717,32.042 -21.717,-21.158 21.683,-21.158 21.683,32.042 ; 22.203,-26.238 25.383,-26.238 ; 22.203,-26.238 25.383,-26.238
  text "1" at -23.525,-17.9 h1.2
  text "A" at -18.2,-23 h1.2
  text "15" at -24.125,17.675 h1.2
  text "R" at 17.36,-23 h1.2
Mechanical 8:
  drawing of 900 lines, arcs and shapes, not listed
Mechanical 14:
  drawing of 478 lines, arcs and shapes, not listed
  text "10" at -21.125,4.475 h1.2
  text "11" at -21.125,7.015 h1.2
  text "12" at -21.125,9.555 h1.2
  text "13" at -21.125,12.095 h1.2
  text "14" at -21.125,14.635 h1.2
  text "9" at -20.525,1.92 h1.2
  text "8" at -20.525,-0.62 h1.2
  text "7" at -20.525,-3.16 h1.2
  text "6" at -20.525,-5.7 h1.2
  text "5" at -20.525,-8.24 h1.2
  text "4" at -20.525,-10.78 h1.2
  text "3" at -20.525,-13.32 h1.2
  text "2" at -20.525,-15.86 h1.2
  text "P" at 14.82,-20.5 h1.2
  text "N" at 12.28,-20.5 h1.2
  text "M" at 9.74,-20.5 h1.2
  text "L" at 7.2,-20.5 h1.2
  text "K" at 4.66,-20.5 h1.2
  text "J" at 2.12,-20.5 h1.2
  text "H" at -0.42,-20.5 h1.2
  text "G" at -2.96,-20.5 h1.2
  text "A" at -5.5,-20.5 h1.2
  text "E" at -8.04,-20.5 h1.2
  text "D" at -10.58,-20.5 h1.2
  text "C" at -13.12,-20.5 h1.2
  text "B" at -15.66,-20.5 h1.2
  text "1" at 0.164,0.45 h0.75
  text "A" at -18.2,-20.5 h1.2
  text "1" at -20.525,-18.4 h1.2
  text "R" at 17.36,-20.5 h1.2
  text "15" at -21.125,17.175 h1.2
3D body "ARIES_225-PRS-15001-12.stp": height 10.87, standoff -3.2, extent -21.717,-26.238 25.903,32.042

## ARIES_225-PRS-15001-12_a [mm] "225 Contacts (15x15), Pitch 2.54mm,  PGA ZIF Test & Burn-in Socket"
height 10.92
Top Overlay:
  circle w0.25: c-22.4,-17.78 r0.125
  lines w0.2: -21.717,-20.958 -21.517,-21.158 ; -21.717,-20.758 -21.317,-21.158 ; -21.717,-20.558 -21.117,-21.158 ; -21.717,-20.358 -20.917,-21.158 ; -21.717,-20.158 -20.717,-21.158 ; -21.717,19.33 21.683,19.33 ; -21.717,29.013 21.683,29.013 ; 21.683,17.312 22.203,18.204 ; 21.683,23.832 21.793,23.832 cw(c21.793,23.422) 22.203,23.422 22.203,-26.238 ; 21.683,27.012 21.793,27.012 cw(c21.793,23.422) 25.383,23.422 25.383,-26.238 ; 25.376,23.647 25.903,24.552 25.903,32.042 21.683,32.042 ; 21.683,32.042 21.683,-21.158 -21.717,-21.158 -21.717,32.042 21.683,32.042 ; 22.203,-26.238 25.383,-26.238 ; 22.203,-26.238 25.383,-26.238
  text "R" at 17.36,-23 h1.2
  text "15" at -24.125,17.175 h1.2
  text "A" at -18.2,-23 h1.2
  text "1" at -23.525,-18.4 h1.2
Mechanical 8:
  drawing of 900 lines, arcs and shapes, not listed
Mechanical 14:
  drawing of 478 lines, arcs and shapes, not listed
  text "15" at -21.125,17.175 h1.2
  text "R" at 17.36,-20.5 h1.2
  text "1" at -20.525,-18.4 h1.2
  text "A" at -18.2,-20.5 h1.2
  text "1" at 0.164,0.45 h0.75
  text "B" at -15.66,-20.5 h1.2
  text "C" at -13.12,-20.5 h1.2
  text "D" at -10.58,-20.5 h1.2
  text "E" at -8.04,-20.5 h1.2
  text "A" at -5.5,-20.5 h1.2
  text "G" at -2.96,-20.5 h1.2
  text "H" at -0.42,-20.5 h1.2
  text "J" at 2.12,-20.5 h1.2
  text "K" at 4.66,-20.5 h1.2
  text "L" at 7.2,-20.5 h1.2
  text "M" at 9.74,-20.5 h1.2
  text "N" at 12.28,-20.5 h1.2
  text "P" at 14.82,-20.5 h1.2
  text "2" at -20.525,-15.86 h1.2
  text "3" at -20.525,-13.32 h1.2
  text "4" at -20.525,-10.78 h1.2
  text "5" at -20.525,-8.24 h1.2
  text "6" at -20.525,-5.7 h1.2
  text "7" at -20.525,-3.16 h1.2
  text "8" at -20.525,-0.62 h1.2
  text "9" at -20.525,1.92 h1.2
  text "14" at -21.125,14.635 h1.2
  text "13" at -21.125,12.095 h1.2
  text "12" at -21.125,9.555 h1.2
  text "11" at -21.125,7.015 h1.2
  text "10" at -21.125,4.475 h1.2
3D body "ARIES_225-PRS-15001-12.stp": height 10.87, standoff -3.2, extent -21.717,-26.238 25.903,32.042

## BIVAR_121-032 [mm] "0.8mm Thick, 4 Holes (0.8mm) TO-18, 3/4 LED Spacer"
height 0.8
Top Overlay:
  circle w0.2: c0,0 r2.35
Mechanical 8:
  lines w0.1: -1.75,0 -1.25,0 ; -1.25,-0.5 -1.25,0 ; -1.25,0.5 -1.25,0 ; -0.75,0 -1.25,0 ; -0.5,-1.25 0,-1.25 ; -0.5,0 0,0 ; -0.5,1.25 0,1.25 ; 0,-1.75 0,-1.25 ; 0,-0.75 0,-1.25 ; 0,-0.5 0,0 ; 0,0.5 0,0 ; 0,0.75 0,1.25 ; 0,1.75 0,1.25 ; 0.5,-1.25 0,-1.25 ; 0.5,0 0,0 ; 0.5,1.25 0,1.25 ; 0.75,0 1.25,0 ; 1.25,-0.5 1.25,0 ; 1.25,0.5 1.25,0 ; 1.75,0 1.25,0
Mechanical 14:
  circle w0.1: c0,0 r2.35
  circle w0.1: c-1.25,0 r0.4
  circle w0.1: c1.25,0 r0.4
  circle w0.1: c0,1.25 r0.4
  circle w0.1: c0,-1.25 r0.4
3D body "BIVAR_121-032.stp": height 0.8, standoff 0, extent -2.35,-2.35 2.35,2.35

## BIVAR_514-120 [mm] "0.120\" (3.048mm) Thickness, White Spacer for TO-5mm 4 Lead"
height 3.048
Top Overlay:
  circle w0.2: c0,0 r4.635
  circle w0.2: c-2.54,-2.54 r0.953
  circle w0.2: c2.54,-2.54 r0.953
  circle w0.2: c2.54,2.54 r0.953
  circle w0.2: c-2.54,2.54 r0.953
Mechanical 8:
  lines w0.1: -3.04,0 -2.54,0 ; -2.54,-0.5 -2.54,0 ; -2.54,0.5 -2.54,0 ; -2.04,0 -2.54,0 ; -0.5,-2.54 0,-2.54 ; -0.5,0 0,0 ; -0.5,2.54 0,2.54 ; 0,-3.04 0,-2.54 ; 0,-2.04 0,-2.54 ; 0,-0.5 0,0 ; 0,0.5 0,0 ; 0,2.04 0,2.54 ; 0,3.04 0,2.54 ; 0.5,-2.54 0,-2.54 ; 0.5,0 0,0 ; 0.5,2.54 0,2.54 ; 2.04,0 2.54,0 ; 2.54,-0.5 2.54,0 ; 2.54,0.5 2.54,0 ; 3.04,0 2.54,0
Mechanical 14:
  circle w0.1: c0,0 r4.635
  circle w0.1: c-2.54,0 r0.635
  circle w0.1: c0,2.54 r0.635
  circle w0.1: c2.54,0 r0.635
  circle w0.1: c0,-2.54 r0.635
  circle w0.1: c-2.54,-2.54 r0.953
  circle w0.1: c2.54,-2.54 r0.953
  circle w0.1: c2.54,2.54 r0.953
  circle w0.1: c-2.54,2.54 r0.953
3D body "BIVAR_514-120.stp": height 3.05, standoff 0, extent -4.635,-4.635 4.636,4.636

## BIVAR_ELM 1-110 [mm] "0.110\" (2.79mm) Black Spacer for 5mm LED - BIVAR ELM 1 Series"
height 2.79
Top Overlay:
  lines w0.2: -2.32,-0.367 -2.513,-0.367 ccw(c0,0) 2.508,-0.4 2.32,-0.4 ; -2.32,0.367 -2.513,0.367 cw(c0,0) 2.508,0.4 2.32,0.4
Mechanical 8:
  lines w0.1: -0.5,0 0,0 ; 0,-0.5 0,0 ; 0,0.5 0,0 ; 0.5,0 0,0
Mechanical 14:
  lines w0.1: -2.513,-0.367 ccw(c0,0) 2.508,-0.4 1.397,-0.4 cw(c1.397,0) 1.397,0.4 2.508,0.4 ccw(c0,0) -2.513,0.367 -1.397,0.367 cw(c-1.397,0) -1.397,-0.367 -2.513,-0.367 ; -0.381,-1.308 ccw(c0,-1.308) 0.381,-1.308 0.381,-0.8 ccw(c0,-0.8) -0.381,-0.8 -0.381,-1.308 ; -0.381,0.8 ccw(c0,0.8) 0.381,0.8 0.381,1.308 ccw(c0,1.308) -0.381,1.308 -0.381,0.8
3D body "BIVAR_ELM 1-110.stp": height 2.79, standoff 0, extent -2.513,-2.54 2.508,2.54

## BIVAR_ELM 2-265 [mm] "0.265\" (6.73mm) Black Spacer for 3mm LED - BIVAR ELM 2 Series"
height 6.73
Top Overlay:
  lines w0.2: -2.164,-1.05 ccw(c0,0) 2.164,-1.05 ; -2.164,1.05 cw(c0,0) 2.164,1.05
Mechanical 8:
  lines w0.1: -0.5,0 0,0 ; 0,-0.5 0,0 ; 0,0.5 0,0 ; 0.5,0 0,0
Mechanical 14:
  lines w0.1: -2.371,-0.406 ccw(c0,0) 2.371,-0.406 1.344,-0.406 cw(c1.344,0) 1.344,0.406 2.371,0.406 ccw(c0,0) -2.371,0.406 -1.271,0.406 cw(c-1.271,0) -1.271,-0.406 -2.371,-0.406 ; -0.508,-1.308 ccw(c0,-1.308) 0.508,-1.308 0.508,-0.546 cw(c1.109,0) 0.508,0.546 0.508,1.308 ccw(c0,1.308) -0.508,1.308 -0.508,0.546 cw(c-1.079,0) -0.508,-0.546 -0.508,-1.308
3D body "BIVAR_ELM 2-265.stp": height 6.73, standoff 0, extent -2.37,-2.405 2.371,2.405

## BIVAR_ELM 3-100 [mm] "0.1\" (2.54mm) Black Spacer for 5mm LED - BIVAR ELM 3 Series"
height 2.54
Top Overlay:
  circle w0.2: c0,0 r3.25
Mechanical 8:
  lines w0.1: -0.5,0 0,0 ; 0,-0.5 0,0 ; 0,0.5 0,0 ; 0.5,0 0,0
Mechanical 14:
  circle w0.1: c0,0 r3.25
  lines w0.1: -2.21,-0.508 cw(c-2.21,0) -2.21,0.508 -1.27,0.508 cw(c-1.27,0) -1.27,-0.508 -2.21,-0.508 ; -0.508,-2.21 ccw(c0,-2.21) 0.508,-2.21 0.508,-1.27 ccw(c0,-1.27) -0.508,-1.27 -0.508,-2.21 ; -0.508,1.27 ccw(c0,1.27) 0.508,1.27 0.508,2.21 ccw(c0,2.21) -0.508,2.21 -0.508,1.27 ; 1.27,-0.508 cw(c1.27,0) 1.27,0.508 2.21,0.508 cw(c2.21,0) 2.21,-0.508 1.27,-0.508
3D body "BIVAR_ELM 3-100.stp": height 2.54, standoff 0, extent -3.25,-3.249 3.25,3.249

## BIVAR_ELM 5-280 [mm] "0.280\" (7.11mm) Black Spacer For 2 Lead 3mm LED - BIVAR ELM 5 Series"
height 7.11
Top Overlay:
  lines w0.2: -1.692,-1 ccw(c0,0) 1.692,-1 ; -1.692,1 cw(c0,0) 1.692,1
Mechanical 8:
  lines w0.1: -0.5,0 0,0 ; 0,-0.5 0,0 ; 0,0.5 0,0 ; 0.5,0 0,0
Mechanical 14:
  circle w0.1: c0,0 r1.965
  lines w0.1: -1.46,-0.254 cw(c-1.46,0) -1.46,0.254 -1.016,0.33 -0.381,0.33 cw(c-0.381,0.076) -0.127,0.076 -0.127,-0.076 cw(c-0.381,-0.076) -0.381,-0.33 -1.016,-0.33 -1.46,-0.254 ; 0.127,-0.076 ccw(c0.381,-0.076) 0.381,-0.33 1.016,-0.33 1.46,-0.254 ccw(c1.46,0) 1.46,0.254 1.016,0.33 0.381,0.33 ccw(c0.381,0.076) 0.127,0.076 0.127,-0.076
3D body "BIVAR_ELM 5-280.stp": height 7.11, standoff 0, extent -1.965,-1.965 1.965,1.965